# Altium footprint library Switches.PcbLib: 117 footprints (part 2 of 8)
Each footprint in its own frame and in the unit in brackets; x right, y up, seen from the top. Pads: shape width x height; smd on the part's side, far side on the other; paste and mask are expansions set on the pad; w line width, h text height; cw(c..) or ccw(c..) is an arc to the next point about the centre after c.
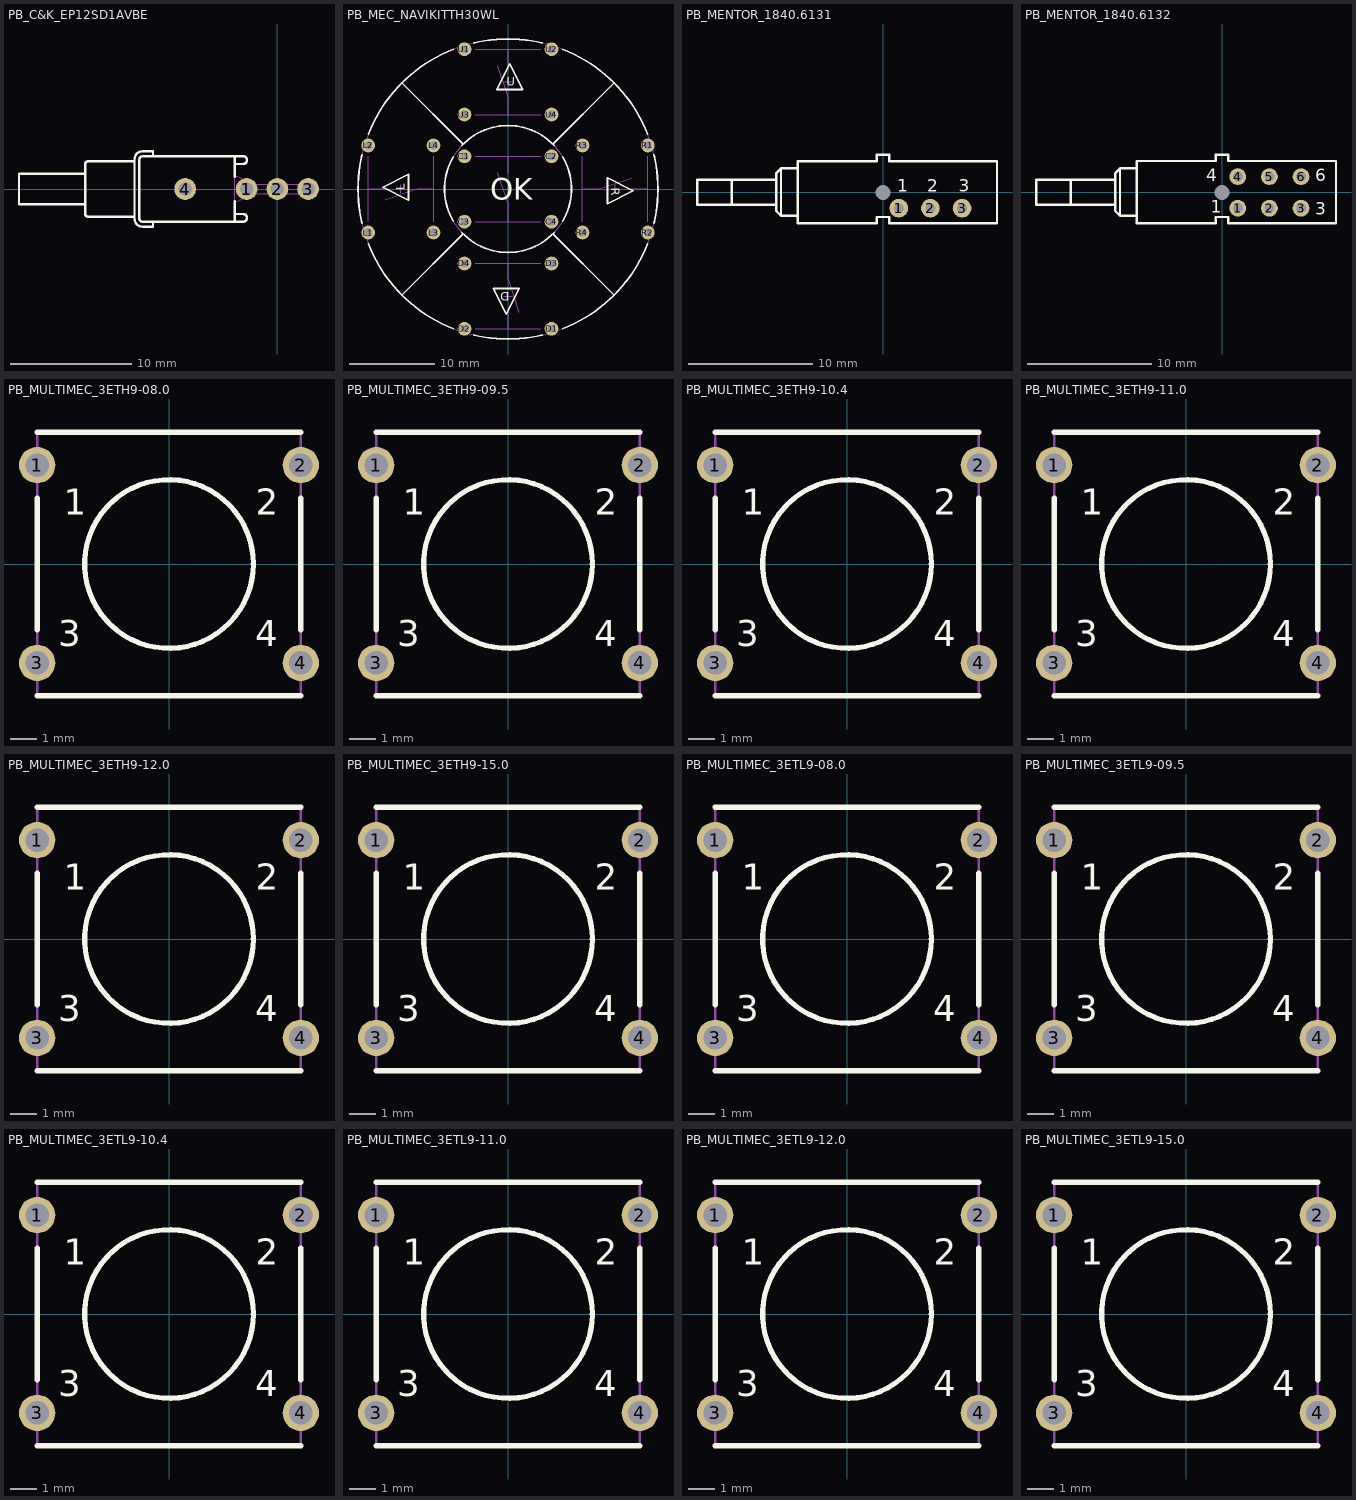
[diagram p1: the footprints below, top view; thin cyan lines are the x and y axes]

## PB_C&K_EP12SD1AVBE [mm] "SPDT Sealed Tiny Pushbutton Switch, Vertical Right Angled PCB Mounting, Unthreaded Bushing, EP Series"
height 8.77
pads (4):
  round 1.8 hole 1.1: 1(-2.54,0) 2(0,0) 3(2.54,0) 4(-7.62,0)
Top Overlay:
  lines w0.2: -15.9,-1.27 -21.36,-1.27 -21.36,1.27 -15.9,1.27 ; -11.81,-2.285 -15.646,-2.285 cw(c-15.646,-2.031) -15.9,-2.031 -15.9,2.031 cw(c-15.646,2.031) -15.646,2.285 -11.81,2.285 ; -10.286,-2.704 -10.286,-3.11 -11.15,-3.11 cw(c-11.15,-2.45) -11.81,-2.45 -11.81,2.45 cw(c-11.15,2.45) -11.15,3.11 -10.286,3.11 -10.286,2.704 ; -3.526,-2.704 -3.526,-0.994 ; -3.526,-2.069 -2.828,-2.069 cw(c-2.828,-2.386) -2.828,-2.704 -11.15,-2.704 cw(c-11.15,-2.45) -11.404,-2.45 -11.404,2.45 cw(c-11.15,2.45) -11.15,2.704 -2.828,2.704 cw(c-2.828,2.386) -2.828,2.069 -3.526,2.069 ; -3.526,0.994 -3.526,2.704
Mechanical 8:
  lines w0.05: -8.12,0 -7.62,0 ; -7.62,-0.5 -7.62,0 ; -7.62,0.5 -7.62,0 ; -7.12,0 -7.62,0 ; -3.04,0 -2.54,0 ; -2.54,-0.5 -2.54,0 ; -2.54,0.5 -2.54,0 ; -2.04,0 -2.54,0 ; -0.5,0 0,0 ; 0,-0.5 0,0 ; 0,0.5 0,0 ; 0.5,0 0,0 ; 2.04,0 2.54,0 ; 2.54,-0.5 2.54,0 ; 2.54,0.5 2.54,0 ; 3.04,0 2.54,0
Mechanical 14:
  lines w0.1: -15.9,-1.27 -21.36,-1.27 -21.36,1.27 -15.9,1.27 ; -11.81,-2.285 -15.646,-2.285 cw(c-15.646,-2.031) -15.9,-2.031 -15.9,2.031 cw(c-15.646,2.031) -15.646,2.285 -11.81,2.285 ; -10.286,-2.704 -10.286,-3.11 -11.15,-3.11 cw(c-11.15,-2.45) -11.81,-2.45 -11.81,2.45 cw(c-11.15,2.45) -11.15,3.11 -10.286,3.11 -10.286,2.704 ; -3.526,-2.704 -3.526,2.704 ; -3.526,-2.069 -2.828,-2.069 cw(c-2.828,-2.386) -2.828,-2.704 -11.15,-2.704 cw(c-11.15,-2.45) -11.404,-2.45 -11.404,2.45 cw(c-11.15,2.45) -11.15,2.704 -2.828,2.704 cw(c-2.828,2.386) -2.828,2.069 -3.526,2.069 ; -3.526,-1.016 ccw(c-3.526,0) -3.526,1.016 ; -2.584,-0.38 2.794,-0.38 2.794,0.381 ; -2.584,0.38 2.795,0.38
3D body "PB_C&K_EP12SD1AVBE.stp": height 8.76, standoff -3.3, extent -21.36,-3.11 2.794,3.11

## PB_MEC_NAVIKITTH30WL [mm] "Navigation Switch Navimec, 4 x 1ZB Keycaps on 3A Switches And 1 x 1ZC on 3F Switches, Blue Color"
height 12.2
pads (20):
  round 1.6 hole 0.9: C1(-5.08,3.81) C2(5.08,3.81) C3(-5.08,-3.81) C4(5.08,-3.81) D1(5.08,-16.31) D2(-5.08,-16.31) D3(5.08,-8.69) D4(-5.08,-8.69) L1(-16.31,-5.08) L2(-16.31,5.08) L3(-8.69,-5.08) L4(-8.69,5.08) R1(16.31,5.08) R2(16.31,-5.08) R3(8.69,5.08) R4(8.69,-5.08) U1(-5.08,16.31) U2(5.08,16.31) U3(-5.08,8.69) U4(5.08,8.69)
Top Overlay:
  lines w0.2: -17.036,-4.002 cw(c0,0) -17.036,4.002 ; -16.296,-6.38 ccw(c0,0) -6.38,-16.296 ; -16.296,6.38 cw(c0,0) -6.38,16.296 ; -12.374,-12.374 -5.233,-5.233 ; -12.374,12.374 -5.233,5.233 ; -6.379,-3.751 cw(c0,0) -6.379,3.751 ; -5.387,-5.073 ccw(c0,0) 5.387,-5.073 ; -5.387,5.073 cw(c0,0) 5.387,5.073 ; -4.002,-17.036 ccw(c0,0) 4.002,-17.036 ; -4.002,17.036 cw(c0,0) 4.002,17.036 ; 5.233,-5.233 12.374,-12.374 ; 5.233,5.233 12.374,12.374 ; 6.379,-3.751 ccw(c0,0) 6.379,3.751 ; 6.38,-16.296 ccw(c0,0) 16.296,-6.38 ; 6.38,16.296 cw(c0,0) 16.296,6.38 ; 17.036,-4.002 ccw(c0,0) 17.036,4.002 ; -14.604,0.208 -11.604,1.708 -11.604,-1.292 -14.604,0.208 ; -1.708,-11.604 1.292,-11.604 -0.208,-14.604 -1.708,-11.604 ; -1.292,11.604 0.208,14.604 1.708,11.604 -1.292,11.604 ; 11.604,-1.708 14.604,-0.208 11.604,1.292 11.604,-1.708
  text "D" at 0.125,-12.05 h1
  text "L" at -12.05,-0.125 h1
  text "R" at 12.05,0.125 h1
  text "U" at -0.125,12.05 h1
  text "OK" at -2.055,-1.25 h2.5
Mechanical 8:
  lines w0.1: -16.81,-5.08 -16.31,-5.08 ; -16.81,5.08 -16.31,5.08 ; -16.31,-5.58 -16.31,-5.08 ; -16.31,-4.58 -16.31,-5.08 ; -16.31,-3.81 -16.31,3.81 ; -16.31,0 -14.405,0 ; -16.31,4.58 -16.31,5.08 ; -16.31,5.58 -16.31,5.08 ; -15.81,-5.08 -16.31,-5.08 ; -15.81,5.08 -16.31,5.08 ; -14.405,-1.27 -10.595,0 -8.69,0 ; -13,0 -12.5,0 ; -12.5,-0.5 -12.5,0 ; -12.5,0.5 -12.5,0 ; -12,0 -12.5,0 ; -9.19,-5.08 -8.69,-5.08 ; -9.19,5.08 -8.69,5.08 ; -8.69,-5.58 -8.69,-5.08 ; -8.69,-4.58 -8.69,-5.08 ; -8.69,-3.81 -8.69,3.81 ; -8.69,4.58 -8.69,5.08 ; -8.69,5.58 -8.69,5.08 ; -8.19,-5.08 -8.69,-5.08 ; -8.19,5.08 -8.69,5.08 ; -5.58,-16.31 -5.08,-16.31 ; -5.58,-8.69 -5.08,-8.69 ; -5.58,-3.81 -5.08,-3.81 ; -5.58,3.81 -5.08,3.81 ; -5.58,8.69 -5.08,8.69 ; -5.58,16.31 -5.08,16.31 ; -5.08,-16.81 -5.08,-16.31 ; -5.08,-15.81 -5.08,-16.31 ; -5.08,-9.19 -5.08,-8.69 ; -5.08,-8.19 -5.08,-8.69 ; -5.08,-4.31 -5.08,-3.81 ; -5.08,-3.31 -5.08,-3.81 ; -5.08,3.31 -5.08,3.81 ; -5.08,4.31 -5.08,3.81 ; -5.08,8.19 -5.08,8.69 ; -5.08,9.19 -5.08,8.69 ; -5.08,15.81 -5.08,16.31 ; -5.08,16.81 -5.08,16.31 ; -4.58,-16.31 -5.08,-16.31 ; -4.58,-8.69 -5.08,-8.69 ; -4.58,-3.81 -5.08,-3.81 ; -4.58,3.81 -5.08,3.81 ; -4.58,8.69 -5.08,8.69 ; -4.58,16.31 -5.08,16.31 ; -3.81,-16.31 3.81,-16.31 ; -3.81,-8.69 3.81,-8.69 ; -3.81,-3.81 3.81,-3.81 ; -3.81,3.81 3.81,3.81 ; -3.81,8.69 3.81,8.69 ; -3.81,16.31 3.81,16.31 ; -1.27,1.905 0,-1.905 0,-3.81 ; -1.27,14.405 0,10.595 0,8.69 ; -0.5,-12.5 0,-12.5 ; -0.5,0 0,0 ; -0.5,12.5 0,12.5 ; 0,-16.31 0,-14.405 ; 0,-13 0,-12.5 ; 0,-12 0,-12.5 ; 0,-8.69 0,-10.595 1.27,-14.405 ; 0,-0.5 0,0 ; 0,0.5 0,0 ; 0,1.905 0,3.81 ; 0,12 0,12.5 ; 0,13 0,12.5 ; 0,14.405 0,16.31 ; 0.5,-12.5 0,-12.5 ; 0.5,0 0,0 ; 0.5,12.5 0,12.5 ; 4.58,-16.31 5.08,-16.31 ; 4.58,-8.69 5.08,-8.69 ; 4.58,-3.81 5.08,-3.81 ; 4.58,3.81 5.08,3.81 ; 4.58,8.69 5.08,8.69 ; 4.58,16.31 5.08,16.31 ; 5.08,-16.81 5.08,-16.31 ; 5.08,-15.81 5.08,-16.31 ; 5.08,-9.19 5.08,-8.69 ; 5.08,-8.19 5.08,-8.69 ; 5.08,-4.31 5.08,-3.81 ; 5.08,-3.31 5.08,-3.81 ; 5.08,3.31 5.08,3.81 ; 5.08,4.31 5.08,3.81 ; 5.08,8.19 5.08,8.69 ; 5.08,9.19 5.08,8.69 ; 5.08,15.81 5.08,16.31 ; 5.08,16.81 5.08,16.31 ; 5.58,-16.31 5.08,-16.31 ; 5.58,-8.69 5.08,-8.69 ; 5.58,-3.81 5.08,-3.81 ; 5.58,3.81 5.08,3.81 ; 5.58,8.69 5.08,8.69 ; 5.58,16.31 5.08,16.31 ; 8.19,-5.08 8.69,-5.08 ; 8.19,5.08 8.69,5.08 ; 8.69,-5.58 8.69,-5.08 ; 8.69,-4.58 8.69,-5.08 ; 8.69,-3.81 8.69,3.81 ; 8.69,0 10.595,0 14.405,1.27 ; 8.69,4.58 8.69,5.08 ; 8.69,5.58 8.69,5.08 ; 9.19,-5.08 8.69,-5.08 ; 9.19,5.08 8.69,5.08 ; 14.405,0 16.31,0 ; 15.81,-5.08 16.31,-5.08 ; 15.81,5.08 16.31,5.08 ; 16.31,-5.58 16.31,-5.08 ; 16.31,-4.58 16.31,-5.08 ; 16.31,-3.81 16.31,3.81 ; 16.31,4.58 16.31,5.08 ; 16.31,5.58 16.31,5.08 ; 16.81,-5.08 16.31,-5.08 ; 16.81,5.08 16.31,5.08 ; 12.5,0 12,0 12.5,0 ; 12.5,0 12.5,-0.5 12.5,0 ; 12.5,0 13,0 12.5,0 ; 12.5,0 12.5,0.5 12.5,0
  text "3" at -4.248,9.525 h1
  text "4" at 3.372,9.525 h1
  text "2" at 3.372,14.605 h1
  text "1" at -4.248,14.605 h1
  text "3" at -4.248,-2.975 h1
  text "4" at 3.372,-2.975 h1
  text "2" at 3.372,2.105 h1
  text "1" at -4.248,2.105 h1
  text "3" at -9.525,-4.248 h1
  text "4" at -9.525,3.372 h1
  text "2" at -14.605,3.372 h1
  text "1" at -14.605,-4.248 h1
  text "3" at 9.525,4.248 h1
  text "4" at 9.525,-3.372 h1
  text "2" at 14.605,-3.372 h1
  text "1" at 14.605,4.248 h1
  text "3" at 4.248,-9.525 h1
  text "4" at -3.372,-9.525 h1
  text "2" at -3.372,-14.605 h1
  text "1" at 4.248,-14.605 h1
Mechanical 14:
  circle w0.1: c0,0 r7.4
  circle w0.1: c0,0 r17.5
  lines w0.1: -12.374,-12.374 -5.233,-5.233 ; -12.374,12.374 -5.233,5.233 ; 5.233,-5.233 12.374,-12.374 ; 5.233,5.233 12.374,12.374 ; -14.604,0.208 -11.604,1.708 -11.604,-1.292 -14.604,0.208 ; -1.708,-11.604 1.292,-11.604 -0.208,-14.604 -1.708,-11.604 ; -1.292,11.604 0.208,14.604 1.708,11.604 -1.292,11.604 ; 11.604,-1.708 14.604,-0.208 11.604,1.292 11.604,-1.708
  text "OK" at -2.055,-1.25 h2.5
3D body "PB_MEC_NAVIKITTH30WL.stp": height 12.22, standoff -4, extent -17.5,-17.5 17.5,17.5

## PB_MENTOR_1840.6131 [mm] "SPDT Push-Button Switch - PCB Edge Mounting - MENTOR_1840.6131"
height 10.1
pads (4):
  round 1.5 hole 0.8: 1(1.27,-1.27) 2(3.81,-1.27) 3(6.35,-1.27)
  round 0.5 hole 1.2 unplated mask+0.35: 4(0,0)
Top Overlay:
  lines w0.2: -14.95,-0.979 -14.95,0.021 -14.95,1.021 ; -14.95,-0.975 -8.6,-0.975 ; -14.95,1.025 -8.6,1.025 ; -12.15,-0.975 -12.15,1.025 ; -6.84,-1.875 -8.2,-1.875 ; -6.84,1.925 -8.2,1.925 ; -8.2,-1.875 -8.6,-1.475 -8.6,1.525 -8.2,1.925 ; -8.2,-1.875 -8.2,1.925 ; -6.84,-2.475 -6.84,2.525 -0.5,2.525 -0.5,3.025 0.5,3.025 0.5,2.525 9.16,2.525 9.16,-2.475 0.5,-2.475 0.5,-1.975 -0.5,-1.975 -0.5,-2.475 -6.84,-2.475
  text "2" at 3.556,0.046 h1
  text "1" at 1.143,0.046 h1
  text "3" at 6.096,0.046 h1
Mechanical 14:
  lines w0.1: -12.151,-0.974 -12.151,1.026 ; -8.601,-0.974 -14.951,-0.974 -14.951,0.026 -14.951,1.026 -8.601,1.026 ; -6.841,-1.874 -8.201,-1.874 ; -6.841,1.926 -8.201,1.926 ; -8.201,-1.874 -8.601,-1.474 -8.601,1.526 -8.201,1.926 ; -8.201,-1.874 -8.201,1.926 ; -6.841,-2.474 -6.841,2.526 -0.501,2.526 -0.501,3.026 0.499,3.026 0.499,2.526 9.159,2.526 9.159,-2.474 0.499,-2.474 0.499,-1.974 -0.501,-1.974 -0.501,-2.474 -6.841,-2.474
  text "2" at 3.555,0.047 h1
  text "1" at 1.142,0.047 h1
  text "3" at 6.095,0.047 h1
3D body "PB_MENTOR_1840.6131.stp": height 10.1, standoff -4, extent -14.9,-2.5 9.16,3

## PB_MENTOR_1840.6132 [mm] "DPDT Push-Button Switch - PCB Edge Mounting - MENTOR_1840.6132"
height 10.1
pads (7):
  round 1.35 hole 0.8: 1(1.27,-1.27) 2(3.81,-1.27) 3(6.35,-1.27) 4(1.27,1.27) 5(3.81,1.27) 6(6.35,1.27)
  round 0.5 hole 1.2 unplated mask+0.3: 7(0,0)
Top Overlay:
  lines w0.2: -12.15,-0.975 -12.15,1.025 ; -8.6,-0.975 -14.95,-0.975 -14.95,0.025 -14.95,1.025 -8.6,1.025 ; -6.84,-1.875 -8.2,-1.875 ; -6.84,1.925 -8.2,1.925 ; -8.2,-1.875 -8.6,-1.475 -8.6,1.525 -8.2,1.925 ; -8.2,-1.875 -8.2,1.925 ; -6.84,-2.475 -6.84,2.525 -0.5,2.525 -0.5,3.025 0.5,3.025 0.5,2.525 9.16,2.525 9.16,-2.475 0.5,-2.475 0.5,-1.975 -0.5,-1.975 -0.5,-2.475 -6.84,-2.475
  text "1" at -0.889,-1.651 h1
  text "4" at -1.27,0.889 h1
  text "6" at 7.493,0.889 h1
  text "3" at 7.493,-1.778 h1
Mechanical 14:
  lines w0.1: -14.95,-0.975 -8.6,-0.975 ; -14.951,-0.971 -14.951,0.029 -14.951,1.029 ; -14.95,1.025 -8.6,1.025 ; -12.15,-0.975 -12.15,1.025 ; -6.84,-1.875 -8.2,-1.875 ; -6.84,1.925 -8.2,1.925 ; -8.2,-1.875 -8.6,-1.475 -8.6,1.525 -8.2,1.925 ; -8.2,-1.875 -8.2,1.925 ; -6.84,-2.475 -6.84,2.525 -0.5,2.525 -0.5,3.025 0.5,3.025 0.5,2.525 9.16,2.525 9.16,-2.475 0.5,-2.475 0.5,-1.975 -0.5,-1.975 -0.5,-2.475 -6.84,-2.475
  text "1" at -0.889,-1.651 h1
  text "4" at -1.27,0.889 h1
  text "6" at 7.493,0.889 h1
  text "3" at 7.493,-1.778 h1
3D body "PB_MENTOR_1840.6132.stp": height 10.1, standoff -4, extent -14.9,-2.5 9.16,3

## PB_MULTIMEC_3ETH9-08.0 [mm] "Body 10.1x10.1mm, Pushbutton Switch, MULTIMEC 3ETH9-08.0"
height 8
pads (4):
  round 1.4 hole 0.9: 1(-5.08,3.81) 2(5.08,3.81) 3(-5.08,-3.81) 4(5.08,-3.81)
Top Overlay:
  circle w0.2: c0,0 r3.25
  lines w0.2: -5.08,-5.08 5.08,-5.08 ; -5.08,-2.54 -5.08,2.54 ; -5.08,5.08 5.08,5.08 ; 5.08,-2.54 5.08,2.54
  text "1" at -4.058,1.905 h1
  text "3" at -4.276,-3.175 h1
  text "4" at 3.32,-3.175 h1
  text "2" at 3.344,1.905 h1
Mechanical 14:
  circle w0.1: c0,0 r3.25
  lines w0.1: -5.08,-4.2 -5.48,-4.2 -5.48,-3.4 -5.08,-3.4 ; -5.08,3.4 -5.48,3.4 -5.48,4.2 -5.08,4.2 ; 5.08,-4.21 5.48,-4.21 5.48,-3.41 5.08,-3.41 ; 5.08,3.41 5.48,3.41 5.48,4.21 5.08,4.21 ; -5.08,-5.08 5.08,-5.08 5.08,5.08 -5.08,5.08 -5.08,-5.08
  text "1" at -4.058,1.905 h1
  text "3" at -4.276,-3.175 h1
  text "4" at 3.32,-3.175 h1
  text "2" at 3.344,1.905 h1
3D body "PB_MULTIMEC_3ETH9-08.stp": height 13.1, standoff -3.6, extent -5.23,-5.05 5.23,5.05

## PB_MULTIMEC_3ETH9-09.5 [mm] "Body 10.1x10.1mm, Pushbutton Switch, MULTIMEC 3ETH9-09.5"
height 9.5
pads (4):
  round 1.4 hole 0.9: 1(-5.08,3.81) 2(5.08,3.81) 3(-5.08,-3.81) 4(5.08,-3.81)
Top Overlay:
  circle w0.2: c0,0 r3.25
  lines w0.2: -5.08,-5.08 5.08,-5.08 ; -5.08,-2.54 -5.08,2.54 ; -5.08,5.08 5.08,5.08 ; 5.08,-2.54 5.08,2.54
  text "2" at 3.344,1.905 h1
  text "4" at 3.32,-3.175 h1
  text "3" at -4.276,-3.175 h1
  text "1" at -4.058,1.905 h1
Mechanical 14:
  circle w0.1: c0,0 r3.25
  lines w0.1: -5.08,-4.21 -5.48,-4.21 -5.48,-3.41 -5.08,-3.41 ; -5.08,3.41 -5.48,3.41 -5.48,4.21 -5.08,4.21 ; 5.08,-4.21 5.48,-4.21 5.48,-3.41 5.08,-3.41 ; 5.08,3.41 5.48,3.41 5.48,4.21 5.08,4.21 ; -5.08,-5.08 -5.08,5.08 5.08,5.08 5.08,-5.08 -5.08,-5.08
  text "2" at 3.344,1.905 h1
  text "4" at 3.32,-3.175 h1
  text "3" at -4.276,-3.175 h1
  text "1" at -4.058,1.905 h1
3D body "PB_MULTIMEC_3ETH9-09.stp": height 14.6, standoff -3.6, extent -5.23,-5.05 5.23,5.05

## PB_MULTIMEC_3ETH9-10.4 [mm] "Body 10.1x10.1mm, Pushbutton Switch, MULTIMEC 3ETH9-10.4"
height 10.4
pads (4):
  round 1.4 hole 0.9: 1(-5.08,3.81) 2(5.08,3.81) 3(-5.08,-3.81) 4(5.08,-3.81)
Top Overlay:
  circle w0.2: c0,0 r3.25
  lines w0.2: -5.08,-5.08 5.08,-5.08 ; -5.08,-2.54 -5.08,2.54 ; -5.08,5.08 5.08,5.08 ; 5.08,-2.54 5.08,2.54
  text "1" at -4.058,1.905 h1
  text "3" at -4.276,-3.175 h1
  text "4" at 3.32,-3.175 h1
  text "2" at 3.344,1.905 h1
Mechanical 14:
  circle w0.1: c0,0 r3.25
  lines w0.1: -5.08,-4.21 -5.48,-4.21 -5.48,-3.41 -5.08,-3.41 ; -5.08,3.41 -5.48,3.41 -5.48,4.21 -5.08,4.21 ; 5.08,-4.21 5.48,-4.21 5.48,-3.41 5.08,-3.41 ; 5.08,3.41 5.48,3.41 5.48,4.21 5.08,4.21 ; -5.08,-5.08 5.08,-5.08 5.08,5.08 -5.08,5.08 -5.08,-5.08
  text "1" at -4.058,1.905 h1
  text "3" at -4.276,-3.175 h1
  text "4" at 3.32,-3.175 h1
  text "2" at 3.344,1.905 h1
3D body "PB_MULTIMEC_3ETH9-10.stp": height 15.5, standoff -3.6, extent -5.23,-5.05 5.23,5.05

## PB_MULTIMEC_3ETH9-11.0 [mm] "Body 10.1x10.1mm, Pushbutton Switch, MULTIMEC 3ETH9-11.0"
height 11
pads (4):
  round 1.4 hole 0.9: 1(-5.08,3.81) 2(5.08,3.81) 3(-5.08,-3.81) 4(5.08,-3.81)
Top Overlay:
  circle w0.2: c0,0 r3.25
  lines w0.2: -5.08,-5.08 5.08,-5.08 ; -5.08,-2.54 -5.08,2.54 ; -5.08,5.08 5.08,5.08 ; 5.08,-2.54 5.08,2.54
  text "1" at -4.058,1.905 h1
  text "3" at -4.276,-3.175 h1
  text "4" at 3.32,-3.175 h1
  text "2" at 3.344,1.905 h1
Mechanical 14:
  circle w0.1: c0,0 r3.25
  lines w0.1: -5.08,-4.21 -5.48,-4.21 -5.48,-3.41 -5.08,-3.41 ; -5.08,3.41 -5.48,3.41 -5.48,4.21 -5.08,4.21 ; 5.08,-4.21 5.48,-4.21 5.48,-3.41 5.08,-3.41 ; 5.08,3.41 5.48,3.41 5.48,4.21 5.08,4.21 ; -5.08,-5.08 5.08,-5.08 5.08,5.08 -5.08,5.08 -5.08,-5.08
  text "1" at -4.058,1.905 h1
  text "3" at -4.276,-3.175 h1
  text "4" at 3.32,-3.175 h1
  text "2" at 3.344,1.905 h1
3D body "PB_MULTIMEC_3ETH9-11.stp": height 16.1, standoff -3.6, extent -5.23,-5.05 5.23,5.05

## PB_MULTIMEC_3ETH9-12.0 [mm] "Body 10.1x10.1mm, Pushbutton Switch, MULTIMEC 3ETH9-12.0"
height 12
pads (4):
  round 1.4 hole 0.9: 1(-5.08,3.81) 2(5.08,3.81) 3(-5.08,-3.81) 4(5.08,-3.81)
Top Overlay:
  circle w0.2: c0,0 r3.25
  lines w0.2: -5.08,-5.08 5.08,-5.08 ; -5.08,-2.54 -5.08,2.54 ; -5.08,5.08 5.08,5.08 ; 5.08,-2.54 5.08,2.54
  text "2" at 3.344,1.905 h1
  text "4" at 3.32,-3.175 h1
  text "3" at -4.276,-3.175 h1
  text "1" at -4.058,1.905 h1
Mechanical 14:
  circle w0.1: c0,0 r3.25
  lines w0.1: -5.08,-4.21 -5.48,-4.21 -5.48,-3.41 -5.08,-3.41 ; -5.08,3.41 -5.48,3.41 -5.48,4.21 -5.08,4.21 ; 5.08,-4.21 5.48,-4.21 5.48,-3.41 5.08,-3.41 ; 5.08,3.41 5.48,3.41 5.48,4.21 5.08,4.21 ; -5.08,-5.08 -5.08,5.08 5.08,5.08 5.08,-5.08 -5.08,-5.08
  text "2" at 3.344,1.905 h1
  text "4" at 3.32,-3.175 h1
  text "3" at -4.276,-3.175 h1
  text "1" at -4.058,1.905 h1
3D body "PB_MULTIMEC_3ETH9-12.stp": height 17.1, standoff -3.6, extent -5.23,-5.05 5.23,5.05

## PB_MULTIMEC_3ETH9-15.0 [mm] "Body 10.1x10.1mm, Pushbutton Switch, MULTIMEC 3ETH9-15.0"
height 15
pads (4):
  round 1.4 hole 0.9: 1(-5.08,3.81) 2(5.08,3.81) 3(-5.08,-3.81) 4(5.08,-3.81)
Top Overlay:
  circle w0.2: c0,0 r3.25
  lines w0.2: -5.08,-5.08 5.08,-5.08 ; -5.08,-2.54 -5.08,2.54 ; -5.08,5.08 5.08,5.08 ; 5.08,-2.54 5.08,2.54
  text "1" at -4.058,1.905 h1
  text "3" at -4.276,-3.175 h1
  text "4" at 3.32,-3.175 h1
  text "2" at 3.344,1.905 h1
Mechanical 14:
  circle w0.1: c0,0 r3.25
  lines w0.1: -5.08,-4.21 -5.48,-4.21 -5.48,-3.41 -5.08,-3.41 ; -5.08,3.41 -5.48,3.41 -5.48,4.21 -5.08,4.21 ; 5.08,-4.21 5.48,-4.21 5.48,-3.41 5.08,-3.41 ; 5.08,3.41 5.48,3.41 5.48,4.21 5.08,4.21 ; -5.08,-5.08 5.08,-5.08 5.08,5.08 -5.08,5.08 -5.08,-5.08
  text "1" at -4.058,1.905 h1
  text "3" at -4.276,-3.175 h1
  text "4" at 3.32,-3.175 h1
  text "2" at 3.344,1.905 h1
3D body "PB_MULTIMEC_3ETH9-15.stp": height 20.1, standoff -3.6, extent -5.23,-5.05 5.23,5.05

## PB_MULTIMEC_3ETL9-08.0 [mm] "Body 10.1x10.1mm, Pushbutton Switch, MULTIMEC 3ETL9-08.0"
height 8
pads (4):
  round 1.4 hole 0.9: 1(-5.08,3.81) 2(5.08,3.81) 3(-5.08,-3.81) 4(5.08,-3.81)
Top Overlay:
  circle w0.2: c0,0 r3.25
  lines w0.2: -5.08,-5.08 5.08,-5.08 ; -5.08,-2.54 -5.08,2.54 ; -5.08,5.08 5.08,5.08 ; 5.08,-2.54 5.08,2.54
  text "1" at -4.058,1.905 h1
  text "3" at -4.276,-3.175 h1
  text "4" at 3.32,-3.175 h1
  text "2" at 3.344,1.905 h1
Mechanical 14:
  circle w0.1: c0,0 r3.25
  lines w0.1: -5.08,-4.2 -5.48,-4.2 -5.48,-3.4 -5.08,-3.4 ; -5.08,3.4 -5.48,3.4 -5.48,4.2 -5.08,4.2 ; 5.08,-4.21 5.48,-4.21 5.48,-3.41 5.08,-3.41 ; 5.08,3.41 5.48,3.41 5.48,4.21 5.08,4.21 ; -5.08,-5.08 5.08,-5.08 5.08,5.08 -5.08,5.08 -5.08,-5.08
  text "1" at -4.058,1.905 h1
  text "3" at -4.276,-3.175 h1
  text "4" at 3.32,-3.175 h1
  text "2" at 3.344,1.905 h1
3D body "PB_MULTIMEC_3ETL9-08.stp": height 13.1, standoff -3.6, extent -5.23,-5.05 5.23,5.05

## PB_MULTIMEC_3ETL9-09.5 [mm] "Body 10.1x10.1mm, Pushbutton Switch, MULTIMEC 3ETL9-09.5"
height 9.5
pads (4):
  round 1.4 hole 0.9: 1(-5.08,3.81) 2(5.08,3.81) 3(-5.08,-3.81) 4(5.08,-3.81)
Top Overlay:
  circle w0.2: c0,0 r3.25
  lines w0.2: -5.08,-5.08 5.08,-5.08 ; -5.08,-2.54 -5.08,2.54 ; -5.08,5.08 5.08,5.08 ; 5.08,-2.54 5.08,2.54
  text "1" at -4.058,1.905 h1
  text "3" at -4.276,-3.175 h1
  text "4" at 3.32,-3.175 h1
  text "2" at 3.344,1.905 h1
Mechanical 14:
  circle w0.1: c0,0 r3.25
  lines w0.1: -5.08,-4.21 -5.48,-4.21 -5.48,-3.41 -5.08,-3.41 ; -5.08,3.41 -5.48,3.41 -5.48,4.21 -5.08,4.21 ; 5.08,-4.21 5.48,-4.21 5.48,-3.41 5.08,-3.41 ; 5.08,3.41 5.48,3.41 5.48,4.21 5.08,4.21 ; -5.08,-5.08 5.08,-5.08 5.08,5.08 -5.08,5.08 -5.08,-5.08
  text "1" at -4.058,1.905 h1
  text "3" at -4.276,-3.175 h1
  text "4" at 3.32,-3.175 h1
  text "2" at 3.344,1.905 h1
3D body "PB_MULTIMEC_3ETL9-09.stp": height 14.6, standoff -3.6, extent -5.23,-5.05 5.23,5.05

## PB_MULTIMEC_3ETL9-10.4 [mm] "Body 10.1x10.1mm, Pushbutton Switch, MULTIMEC 3ETL9-10.4"
height 10.4
pads (4):
  round 1.4 hole 0.9: 1(-5.08,3.81) 2(5.08,3.81) 3(-5.08,-3.81) 4(5.08,-3.81)
Top Overlay:
  circle w0.2: c0,0 r3.25
  lines w0.2: -5.08,-5.08 5.08,-5.08 ; -5.08,-2.54 -5.08,2.54 ; -5.08,5.08 5.08,5.08 ; 5.08,-2.54 5.08,2.54
  text "1" at -4.058,1.905 h1
  text "3" at -4.276,-3.175 h1
  text "4" at 3.32,-3.175 h1
  text "2" at 3.344,1.905 h1
Mechanical 14:
  circle w0.1: c0,0 r3.25
  lines w0.1: -5.08,-4.21 -5.48,-4.21 -5.48,-3.41 -5.08,-3.41 ; -5.08,3.41 -5.48,3.41 -5.48,4.21 -5.08,4.21 ; 5.08,-4.21 5.48,-4.21 5.48,-3.41 5.08,-3.41 ; 5.08,3.41 5.48,3.41 5.48,4.21 5.08,4.21 ; -5.08,-5.08 5.08,-5.08 5.08,5.08 -5.08,5.08 -5.08,-5.08
  text "1" at -4.058,1.905 h1
  text "3" at -4.276,-3.175 h1
  text "4" at 3.32,-3.175 h1
  text "2" at 3.344,1.905 h1
3D body "PB_MULTIMEC_3ETL9-10.stp": height 15.5, standoff -3.6, extent -5.23,-5.05 5.23,5.05

## PB_MULTIMEC_3ETL9-11.0 [mm] "Body 10.1x10.1mm, Pushbutton Switch, MULTIMEC 3ETL9-11.0"
height 11
pads (4):
  round 1.4 hole 0.9: 1(-5.08,3.81) 2(5.08,3.81) 3(-5.08,-3.81) 4(5.08,-3.81)
Top Overlay:
  circle w0.2: c0,0 r3.25
  lines w0.2: -5.08,-5.08 5.08,-5.08 ; -5.08,-2.54 -5.08,2.54 ; -5.08,5.08 5.08,5.08 ; 5.08,-2.54 5.08,2.54
  text "2" at 3.344,1.905 h1
  text "4" at 3.32,-3.175 h1
  text "3" at -4.276,-3.175 h1
  text "1" at -4.058,1.905 h1
Mechanical 14:
  circle w0.1: c0,0 r3.25
  lines w0.1: -5.08,-4.21 -5.48,-4.21 -5.48,-3.41 -5.08,-3.41 ; -5.08,3.41 -5.48,3.41 -5.48,4.21 -5.08,4.21 ; 5.08,-4.21 5.48,-4.21 5.48,-3.41 5.08,-3.41 ; 5.08,3.41 5.48,3.41 5.48,4.21 5.08,4.21 ; -5.08,-5.08 -5.08,5.08 5.08,5.08 5.08,-5.08 -5.08,-5.08
  text "2" at 3.344,1.905 h1
  text "4" at 3.32,-3.175 h1
  text "3" at -4.276,-3.175 h1
  text "1" at -4.058,1.905 h1
3D body "PB_MULTIMEC_3ETL9-11.stp": height 16.1, standoff -3.6, extent -5.23,-5.05 5.23,5.05

## PB_MULTIMEC_3ETL9-12.0 [mm] "Body 10.1x10.1mm, Pushbutton Switch, MULTIMEC 3ETL9-12.0"
height 12
pads (4):
  round 1.4 hole 0.9: 1(-5.08,3.81) 2(5.08,3.81) 3(-5.08,-3.81) 4(5.08,-3.81)
Top Overlay:
  circle w0.2: c0,0 r3.25
  lines w0.2: -5.08,-5.08 5.08,-5.08 ; -5.08,-2.54 -5.08,2.54 ; -5.08,5.08 5.08,5.08 ; 5.08,-2.54 5.08,2.54
  text "2" at 3.344,1.905 h1
  text "4" at 3.32,-3.175 h1
  text "3" at -4.276,-3.175 h1
  text "1" at -4.058,1.905 h1
Mechanical 14:
  circle w0.1: c0,0 r3.25
  lines w0.1: -5.08,-4.21 -5.48,-4.21 -5.48,-3.41 -5.08,-3.41 ; -5.08,3.41 -5.48,3.41 -5.48,4.21 -5.08,4.21 ; 5.08,-4.21 5.48,-4.21 5.48,-3.41 5.08,-3.41 ; 5.08,3.41 5.48,3.41 5.48,4.21 5.08,4.21 ; -5.08,-5.08 -5.08,5.08 5.08,5.08 5.08,-5.08 -5.08,-5.08
  text "2" at 3.344,1.905 h1
  text "4" at 3.32,-3.175 h1
  text "3" at -4.276,-3.175 h1
  text "1" at -4.058,1.905 h1
3D body "PB_MULTIMEC_3ETL9-12.stp": height 17.1, standoff -3.6, extent -5.23,-5.05 5.23,5.05

## PB_MULTIMEC_3ETL9-15.0 [mm] "Body 10.1x10.1mm, Pushbutton Switch, MULTIMEC 3ETL9-15.0"
height 15
pads (4):
  round 1.4 hole 0.9: 1(-5.08,3.81) 2(5.08,3.81) 3(-5.08,-3.81) 4(5.08,-3.81)
Top Overlay:
  circle w0.2: c0,0 r3.25
  lines w0.2: -5.08,-5.08 5.08,-5.08 ; -5.08,-2.54 -5.08,2.54 ; -5.08,5.08 5.08,5.08 ; 5.08,-2.54 5.08,2.54
  text "1" at -4.058,1.905 h1
  text "3" at -4.276,-3.175 h1
  text "4" at 3.32,-3.175 h1
  text "2" at 3.344,1.905 h1
Mechanical 14:
  circle w0.1: c0,0 r3.25
  lines w0.1: -5.08,-4.21 -5.48,-4.21 -5.48,-3.41 -5.08,-3.41 ; -5.08,3.41 -5.48,3.41 -5.48,4.21 -5.08,4.21 ; 5.08,-4.21 5.48,-4.21 5.48,-3.41 5.08,-3.41 ; 5.08,3.41 5.48,3.41 5.48,4.21 5.08,4.21 ; -5.08,-5.08 5.08,-5.08 5.08,5.08 -5.08,5.08 -5.08,-5.08
  text "1" at -4.058,1.905 h1
  text "3" at -4.276,-3.175 h1
  text "4" at 3.32,-3.175 h1
  text "2" at 3.344,1.905 h1
3D body "PB_MULTIMEC_3ETL9-15.stp": height 20.1, standoff -3.6, extent -5.23,-5.05 5.23,5.05